# Altium footprint library Miscellaneous THD.PcbLib: 216 footprints (part 6 of 15)
Each footprint in its own frame and in the unit in brackets; x right, y up, seen from the top. Pads: shape width x height; smd on the part's side, far side on the other; paste and mask are expansions set on the pad; w line width, h text height; cw(c..) or ccw(c..) is an arc to the next point about the centre after c.
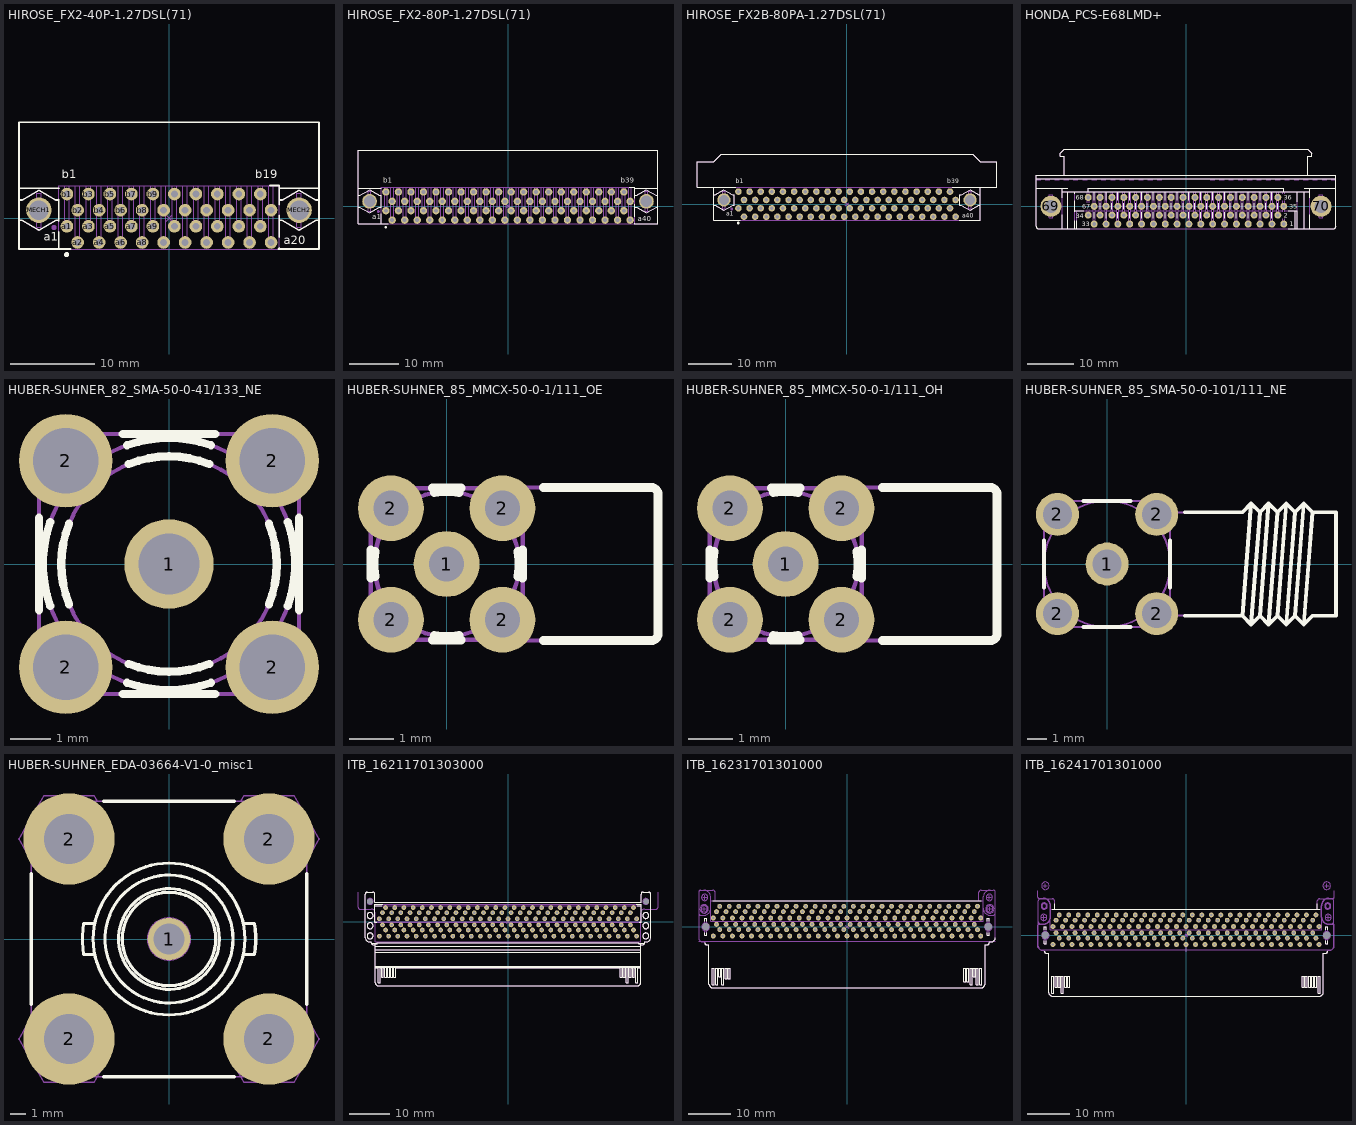
[diagram p5: the footprints below, top view; thin cyan lines are the x and y axes]

## HIROSE_FX2-40P-1.27DSL(71) [mm] "40 Contacts, 1.27mm Pitch, Right Angle Board to Board & Mezzanine Header with Prefixed Pin"
height 7.5
pads (42):
  round 1.5 hole 0.8: a1(-12.065,-0.953) a2(-10.795,-2.858) a3(-9.525,-0.953) a4(-8.255,-2.858) a5(-6.985,-0.953) a6(-5.715,-2.858) a7(-4.445,-0.953) a8(-3.175,-2.858) a9(-1.905,-0.953) a10(-0.635,-2.858) a11(0.635,-0.953) a12(1.905,-2.858) a13(3.175,-0.953) a14(4.445,-2.858) a15(5.715,-0.953) a16(6.985,-2.858) a17(8.255,-0.953) a18(9.525,-2.858) a19(10.795,-0.953) a20(12.065,-2.858) b1(-12.065,2.858) b2(-10.795,0.953) b3(-9.525,2.858) b4(-8.255,0.953) b5(-6.985,2.858) b6(-5.715,0.953) b7(-4.445,2.858) b8(-3.175,0.953) b9(-1.905,2.858) b10(-0.635,0.953) b11(0.635,2.858) b12(1.905,0.953) b13(3.175,2.858) b14(4.445,0.953) b15(5.715,2.858) b16(6.985,0.953) b17(8.255,2.858) b18(9.525,0.953) b19(10.795,2.858) b20(12.065,0.953)
  round 3 hole 2.3: MECH1(-15.375,0.953) MECH2(15.375,0.953)
Top Overlay:
  circle w0.3: c-12.1,-4.3 r0.15
  lines w0.2: -17.725,-0.243 -17.375,-0.243 -15.375,-1.398 -13.375,-0.243 -13.025,-0.243 ; -17.725,2.148 -17.375,2.148 -15.375,3.303 -13.375,2.148 -13.025,2.148 ; -13.025,-3.643 -13.025,-1.586 ; -13.025,-0.319 -13.025,2.224 ; -11.635,-3.643 -17.725,-3.643 -17.725,11.358 17.725,11.358 17.725,-3.643 12.905,-3.643 ; 11.944,3.858 13.025,3.858 13.025,1.586 ; 13.025,-3.643 13.025,-3.491 ; 13.025,-2.224 13.025,0.319 ; 13.025,-0.243 13.375,-0.243 15.375,-1.398 17.375,-0.243 17.725,-0.243 ; 13.025,2.148 13.375,2.148 15.375,3.303 17.375,2.148 17.725,2.148 ; -17.725,3.558 -12.977,3.558 -17.725,3.558 ; 13.025,3.558 17.725,3.558 13.025,3.558
  text "b19" at 10.213,4.742 h1
  text "b1" at -12.647,4.742 h1
  text "a20" at 13.588,-3.085 h1
  text "a1" at -14.787,-2.66 h1
Mechanical 8:
  drawing of 172 lines, arcs and shapes, not listed
Mechanical 14:
  circle w0.3: c-13.6,-1.1 r0.15
  lines w0.1: -17.725,-0.243 -17.375,-0.243 -15.375,-1.398 -13.375,-0.243 -13.025,-0.243 ; -17.725,2.148 -17.375,2.148 -15.375,3.303 -13.375,2.148 -13.025,2.148 ; -13.025,-3.643 -13.025,3.858 13.025,3.858 13.025,-3.643 ; -12.34,3.858 -12.34,-1.102 -11.79,-1.102 -11.79,3.858 ; -11.07,3.858 -11.07,-3.008 -10.52,-3.008 -10.52,3.858 ; -9.8,3.858 -9.8,-1.102 -9.25,-1.102 -9.25,3.858 ; -8.53,3.858 -8.53,-3.008 -7.98,-3.008 -7.98,3.858 ; -7.26,3.858 -7.26,-1.102 -6.71,-1.102 -6.71,3.858 ; -5.99,3.858 -5.99,-3.008 -5.44,-3.008 -5.44,3.858 ; -4.72,3.858 -4.72,-1.102 -4.17,-1.102 -4.17,3.858 ; -3.45,3.858 -3.45,-3.008 -2.9,-3.008 -2.9,3.858 ; -2.18,3.858 -2.18,-1.102 -1.63,-1.102 -1.63,3.858 ; -0.91,3.858 -0.91,-3.008 -0.36,-3.008 -0.36,3.858 ; 0.36,3.858 0.36,-1.102 0.91,-1.102 0.91,3.858 ; 1.63,3.858 1.63,-3.008 2.18,-3.008 2.18,3.858 ; 2.9,3.858 2.9,-1.102 3.45,-1.102 3.45,3.858 ; 4.17,3.858 4.17,-3.008 4.72,-3.008 4.72,3.858 ; 5.44,3.858 5.44,-1.102 5.99,-1.102 5.99,3.858 ; 6.71,3.858 6.71,-3.008 7.26,-3.008 7.26,3.858 ; 7.98,3.858 7.98,-1.102 8.53,-1.102 8.53,3.858 ; 9.25,3.858 9.25,-3.008 9.8,-3.008 9.8,3.858 ; 10.52,3.858 10.52,-1.102 11.07,-1.102 11.07,3.858 ; 11.79,3.858 11.79,-3.008 12.34,-3.008 12.34,3.858 ; 13.025,-0.243 13.375,-0.243 15.375,-1.398 17.375,-0.243 17.725,-0.243 ; 13.025,2.148 13.375,2.148 15.375,3.303 17.375,2.148 17.725,2.148 ; -17.725,-3.643 -17.725,11.358 17.725,11.358 17.725,-3.643 -17.725,-3.643 ; -17.725,3.558 -13.025,3.558 -17.725,3.558 ; -15.625,-1.048 -15.125,-1.048 -15.125,2.953 -15.625,2.953 -15.625,-1.048 ; 13.025,3.558 17.725,3.558 13.025,3.558 ; 15.125,-1.048 15.625,-1.048 15.625,2.953 15.125,2.953 15.125,-1.048
  text "b19" at 10.213,4.742 h1
  text "b1" at -12.647,4.742 h1
  text "a20" at 13.588,-3.085 h1
  text "a1" at -14.787,-2.66 h1
3D body "HIROSE_FX2-40P-1.27DSL(71).stp": height 7.5, standoff -3.3, extent -17.725,-3.642 17.725,11.358

## HIROSE_FX2-80P-1.27DSL(71) [mm] "80 Contacts, 1.27mm Pitch, Right Angle Board to Board & Mezzanine Header with Prefixed Pin"
height 7.5
pads (82):
  round 1.5 hole 0.8: a1(-24.765,-0.953) a2(-23.495,-2.858) a3(-22.225,-0.953) a4(-20.955,-2.858) a5(-19.685,-0.953) a6(-18.415,-2.858) a7(-17.145,-0.953) a8(-15.875,-2.858) a9(-14.605,-0.953) a10(-13.335,-2.858) a11(-12.065,-0.953) a12(-10.795,-2.858) a13(-9.525,-0.953) a14(-8.255,-2.858) a15(-6.985,-0.953) a16(-5.715,-2.858) a17(-4.445,-0.953) a18(-3.175,-2.858) a19(-1.905,-0.953) a20(-0.635,-2.858) a21(0.635,-0.953) a22(1.905,-2.858) a23(3.175,-0.953) a24(4.445,-2.858) a25(5.715,-0.953) a26(6.985,-2.858) a27(8.255,-0.953) a28(9.525,-2.858) a29(10.795,-0.953) a30(12.065,-2.858) a31(13.335,-0.953) a32(14.605,-2.858) a33(15.875,-0.953) a34(17.145,-2.858) a35(18.415,-0.953) a36(19.685,-2.858) a37(20.955,-0.953) a38(22.225,-2.858) a39(23.495,-0.953) a40(24.765,-2.858) b1(-24.765,2.858) b2(-23.495,0.953) b3(-22.225,2.858) b4(-20.955,0.953) b5(-19.685,2.858) b6(-18.415,0.953) b7(-17.145,2.858) b8(-15.875,0.953) b9(-14.605,2.858) b10(-13.335,0.953) b11(-12.065,2.858) b12(-10.795,0.953) b13(-9.525,2.858) b14(-8.255,0.953) b15(-6.985,2.858) b16(-5.715,0.953) b17(-4.445,2.858) b18(-3.175,0.953) b19(-1.905,2.858) b20(-0.635,0.953) b21(0.635,2.858) b22(1.905,0.953) b23(3.175,2.858) b24(4.445,0.953) b25(5.715,2.858) b26(6.985,0.953) b27(8.255,2.858) b28(9.525,0.953) b29(10.795,2.858) b30(12.065,0.953) b31(13.335,2.858) b32(14.605,0.953) b33(15.875,2.858) b34(17.145,0.953) b35(18.415,2.858) b36(19.685,0.953) b37(20.955,2.858) b38(22.225,0.953) b39(23.495,2.858) b40(24.765,0.953)
  round 3 hole 2.3: MECH1(-28.075,0.953) MECH2(28.075,0.953)
Top Overlay:
  circle w0.3: c-24.8,-4.3 r0.15
  lines w0.2: -30.425,-0.243 -30.075,-0.243 -28.075,-1.398 -26.075,-0.243 -25.725,-0.243 ; -30.425,2.148 -30.075,2.148 -28.075,3.303 -26.075,2.148 -25.725,2.148 ; -25.725,-3.643 -25.725,-1.586 ; -25.725,-0.319 -25.725,2.224 ; -24.335,-3.643 -30.425,-3.643 -30.425,11.358 30.425,11.358 30.425,-3.643 25.605,-3.643 ; 24.644,3.858 25.725,3.858 25.725,1.586 ; 25.725,-3.643 25.725,-3.491 ; 25.725,-2.224 25.725,0.319 ; 25.725,-0.243 26.075,-0.243 28.075,-1.398 30.075,-0.243 30.425,-0.243 ; 25.725,2.148 26.075,2.148 28.075,3.303 30.075,2.148 30.425,2.148 ; -30.425,3.558 -25.725,3.558 -30.425,3.558 ; 25.725,3.558 30.425,3.558 25.725,3.558
  text "b1" at -25.347,4.742 h1
  text "b39" at 22.913,4.742 h1
  text "a1" at -27.487,-2.66 h1
  text "a40" at 26.288,-3.085 h1
Mechanical 8:
  drawing of 332 lines, arcs and shapes, not listed
Mechanical 14:
  drawing of 156 lines, arcs and shapes, not listed
  text "b1" at -25.347,4.742 h1
  text "b39" at 22.913,4.742 h1
  text "a1" at -27.487,-2.66 h1
  text "a40" at 26.288,-3.085 h1
3D body "HIROSE_FX2-80P-1.27DSL(71).stp": height 7.5, standoff -3.3, extent -30.425,-3.642 30.425,11.358

## HIROSE_FX2B-80PA-1.27DSL(71) [mm] "80 Contacts, 1.27mm Pitch, Right Angle Board to Board & Mezzanine Header with Prefixed Pin"
height 7.5
pads (82):
  round 1.5 hole 0.8: a1(-24.765,-0.953) a2(-23.495,-2.858) a3(-22.225,-0.953) a4(-20.955,-2.858) a5(-19.685,-0.953) a6(-18.415,-2.858) a7(-17.145,-0.953) a8(-15.875,-2.858) a9(-14.605,-0.953) a10(-13.335,-2.858) a11(-12.065,-0.953) a12(-10.795,-2.858) a13(-9.525,-0.953) a14(-8.255,-2.858) a15(-6.985,-0.953) a16(-5.715,-2.858) a17(-4.445,-0.953) a18(-3.175,-2.858) a19(-1.905,-0.953) a20(-0.635,-2.858) a21(0.635,-0.953) a22(1.905,-2.858) a23(3.175,-0.953) a24(4.445,-2.858) a25(5.715,-0.953) a26(6.985,-2.858) a27(8.255,-0.953) a28(9.525,-2.858) a29(10.795,-0.953) a30(12.065,-2.858) a31(13.335,-0.953) a32(14.605,-2.858) a33(15.875,-0.953) a34(17.145,-2.858) a35(18.415,-0.953) a36(19.685,-2.858) a37(20.955,-0.953) a38(22.225,-2.858) a39(23.495,-0.953) a40(24.765,-2.858) b1(-24.765,2.858) b2(-23.495,0.953) b3(-22.225,2.858) b4(-20.955,0.953) b5(-19.685,2.858) b6(-18.415,0.953) b7(-17.145,2.858) b8(-15.875,0.953) b9(-14.605,2.858) b10(-13.335,0.953) b11(-12.065,2.858) b12(-10.795,0.953) b13(-9.525,2.858) b14(-8.255,0.953) b15(-6.985,2.858) b16(-5.715,0.953) b17(-4.445,2.858) b18(-3.175,0.953) b19(-1.905,2.858) b20(-0.635,0.953) b21(0.635,2.858) b22(1.905,0.953) b23(3.175,2.858) b24(4.445,0.953) b25(5.715,2.858) b26(6.985,0.953) b27(8.255,2.858) b28(9.525,0.953) b29(10.795,2.858) b30(12.065,0.953) b31(13.335,2.858) b32(14.605,0.953) b33(15.875,2.858) b34(17.145,0.953) b35(18.415,2.858) b36(19.685,0.953) b37(20.955,2.858) b38(22.225,0.953) b39(23.495,2.858) b40(24.765,0.953)
  round 3 hole 2.3: MECH1(-28.075,0.953) MECH2(28.075,0.953)
Top Overlay:
  circle w0.3: c-24.8,-4.3 r0.15
  lines w0.2: -30.425,-0.243 -30.075,-0.243 -28.075,-1.398 -26.075,-0.243 -25.725,-0.243 -25.725,2.148 -26.075,2.148 -28.075,3.303 -30.075,2.148 -30.425,2.148 ; -30.425,3.858 -30.425,-3.643 -24.335,-3.643 ; -25.333,3.858 -34.215,3.858 -34.215,9.708 -30.375,9.708 -28.675,11.358 28.675,11.358 30.375,9.708 34.215,9.708 34.215,3.858 24.063,3.858 ; 25.605,-3.643 30.425,-3.643 30.425,3.858 ; 30.425,-0.243 30.075,-0.243 28.075,-1.398 26.075,-0.243 25.725,-0.243 25.725,2.148 26.075,2.148 28.075,3.303 30.075,2.148 30.425,2.148
  text "b39" at 22.913,4.742 h1
  text "b1" at -25.347,4.742 h1
  text "a40" at 26.288,-3.085 h1
  text "a1" at -27.487,-2.66 h1
Mechanical 8:
  drawing of 332 lines, arcs and shapes, not listed
Mechanical 14:
  circle w0.3: c-26.3,-1.1 r0.15
  lines w0.1: -30.425,-0.243 -30.075,-0.243 -28.075,-1.398 -26.075,-0.243 -25.725,-0.243 -25.725,2.148 -26.075,2.148 -28.075,3.303 -30.075,2.148 -30.425,2.148 ; -30.425,3.858 -30.425,-3.643 30.425,-3.643 30.425,3.858 ; 30.425,-0.243 30.075,-0.243 28.075,-1.398 26.075,-0.243 25.725,-0.243 25.725,2.148 26.075,2.148 28.075,3.303 30.075,2.148 30.425,2.148 ; -34.215,3.858 -34.215,9.708 -30.375,9.708 -28.675,11.358 28.675,11.358 30.375,9.708 34.215,9.708 34.215,3.858 -34.215,3.858 ; -28.325,-1.048 -28.325,2.953 -27.825,2.953 -27.825,-1.048 -28.325,-1.048 ; 27.825,-1.048 27.825,2.953 28.325,2.953 28.325,-1.048 27.825,-1.048
  text "b39" at 22.913,4.742 h1
  text "b1" at -25.347,4.742 h1
  text "a40" at 26.288,-3.085 h1
  text "a1" at -27.487,-2.66 h1
3D body "HIROSE_FX2B-80PA-1.27DSL(71).stp": height 7.5, standoff -3.3, extent -34.215,-3.642 34.215,11.358

## HONDA_PCS-E68LMD+ [mm] "1.27mm Pitch Connector, 68 Male Contacts, Right-Angle, PCS Series"
height 9.77
pads (70):
  round 1.5 hole 0.8: 1(20.955,-3.81) 2(19.685,-1.905) 3(18.415,-3.81) 4(17.145,-1.905) 5(15.875,-3.81) 6(14.605,-1.905) 7(13.335,-3.81) 8(12.065,-1.905) 9(10.795,-3.81) 10(9.525,-1.905) 11(8.255,-3.81) 12(6.985,-1.905) 13(5.715,-3.81) 14(4.445,-1.905) 15(3.175,-3.81) 16(1.905,-1.905) 17(0.635,-3.81) 18(-0.635,-1.905) 19(-1.905,-3.81) 20(-3.175,-1.905) 21(-4.445,-3.81) 22(-5.715,-1.905) 23(-6.985,-3.81) 24(-8.255,-1.905) 25(-9.525,-3.81) 26(-10.795,-1.905) 27(-12.065,-3.81) 28(-13.335,-1.905) 29(-14.605,-3.81) 30(-15.875,-1.905) 31(-17.145,-3.81) 32(-18.415,-1.905) 33(-19.685,-3.81) 34(-20.955,-1.905) 35(20.955,0) 36(19.685,1.905) 37(18.415,0) 38(17.145,1.905) 39(15.875,0) 40(14.605,1.905) 41(13.335,0) 42(12.065,1.905) 43(10.795,0) 44(9.525,1.905) 45(8.255,0) 46(6.985,1.905) 47(5.715,0) 48(4.445,1.905) 49(3.175,0) 50(1.905,1.905) 51(0.635,0) 52(-0.635,1.905) 53(-1.905,0) 54(-3.175,1.905) 55(-4.445,0) 56(-5.715,1.905) 57(-6.985,0) 58(-8.255,1.905) 59(-9.525,0) 60(-10.795,1.905) 61(-12.065,0) 62(-13.335,1.905) 63(-14.605,0) 64(-15.875,1.905) 65(-17.145,0) 66(-18.415,1.905) 67(-19.685,0) 68(-20.955,1.905)
  round 4.5 hole 2.8: 69(-28.95,0) 70(28.95,0)
Top Overlay:
  lines w0.2: -32.15,3.905 -25.355,3.905 ; -32.15,5.905 32.15,5.905 ; -26.555,-4.795 -26.555,-1.778 ; -26.555,1.778 -26.555,3.905 ; -26.555,3.105 26.555,3.105 ; -26.05,6.705 -26.05,10.705 -26.9,10.705 -26.9,11.355 -26.05,12.205 26.05,12.205 26.9,11.355 26.9,10.705 26.05,10.705 26.05,6.705 ; -25.355,-4.795 -25.355,3.105 ; -23.855,-4.795 -23.855,-3.048 ; -23.855,-1.143 -23.855,1.143 ; -23.855,-0.953 -21.907,-0.953 ; -23.855,2.667 -23.855,3.105 ; -23.455,-4.795 -23.455,-3.048 ; -21,3.105 -21,3.905 21,3.905 21,3.105 ; -20.637,-4.795 -31.65,-4.795 cw(c-31.65,-4.295) -32.15,-4.295 -32.15,6.705 32.15,6.705 32.15,-4.295 cw(c31.65,-4.295) 31.65,-4.795 21.936,-4.795 ; -19.685,-2.54 -19.685,-1.27 ; -19.685,1.27 -19.685,3.105 ; -18.415,-0.635 -18.415,0.635 ; -17.145,-2.54 -17.145,-1.27 ; -17.145,1.27 -17.145,3.105 ; -15.875,-0.635 -15.875,0.635 ; -14.605,-2.54 -14.605,-1.27 ; -14.605,1.27 -14.605,3.105 ; -13.335,-0.635 -13.335,0.635 ; -12.065,-2.54 -12.065,-1.27 ; -12.065,1.27 -12.065,3.105 ; -10.795,-0.635 -10.795,0.635 ; -9.525,-2.54 -9.525,-1.27 ; -9.525,1.27 -9.525,3.105 ; -8.255,-0.635 -8.255,0.635 ; -6.985,-2.54 -6.985,-1.27 ; -6.985,1.27 -6.985,3.105 ; -5.715,-0.635 -5.715,0.635 ; -4.445,-2.54 -4.445,-1.27 ; -4.445,1.27 -4.445,3.105 ; -3.175,-0.635 -3.175,0.635 ; -1.905,-2.54 -1.905,-1.27 ; -1.905,1.27 -1.905,3.105 ; -0.635,-0.635 -0.635,0.635 ; 0.635,-2.54 0.635,-1.27 ; 0.635,1.27 0.635,3.105 ; 1.905,-0.635 1.905,0.635 ; 3.175,-2.54 3.175,-1.27 ; 3.175,1.27 3.175,3.105 ; 4.445,-0.635 4.445,0.635 ; 5.715,-2.54 5.715,-1.27 ; 5.715,1.27 5.715,3.105 ; 6.985,-0.635 6.985,0.635 ; 8.255,-2.54 8.255,-1.27 ; 8.255,1.27 8.255,3.105 ; 9.525,-0.635 9.525,0.635 ; 10.795,-2.54 10.795,-1.27 ; 10.795,1.27 10.795,3.105 ; 12.065,-0.635 12.065,0.635 ; 13.335,-2.54 13.335,-1.27 ; 13.335,1.27 13.335,3.105 ; 14.605,-0.635 14.605,0.635 ; 15.875,-2.54 15.875,-1.27 ; 15.875,1.27 15.875,3.105 ; 17.145,-0.635 17.145,0.635 ; 18.415,-2.54 18.415,-1.27 ; 18.415,1.27 18.415,3.105 ; 19.685,-0.635 19.685,0.635 ; 21.945,-0.953 23.855,-0.953 23.855,-4.795 ; 23.455,-4.795 23.455,-0.953 ; 23.855,1.016 23.855,3.105 ; 25.355,-4.795 25.355,3.105 ; 25.355,3.905 32.15,3.905 ; 26.555,-4.795 26.555,-1.778 ; 26.555,1.778 26.555,3.905
  text "33" at -22.345,-4.31 h1
  text "1" at 22.213,-4.31 h1
  text "2" at 20.929,-2.405 h1
  text "36" at 20.976,1.405 h1
  text "67" at -22.245,-0.5 h1
  text "34" at -23.638,-2.532 h1
  text "68" at -23.615,1.405 h1
  text "35" at 22.095,-0.5 h1
Mechanical 8:
  lines w0.1: -32.15,5.705 -31.15,5.705 ; -30.15,5.705 -29.15,5.705 ; -28.15,5.705 -27.15,5.705 ; -26.15,5.705 -25.15,5.705 ; -24.15,5.705 -23.15,5.705 ; -22.15,5.705 -21.15,5.705 ; -20.15,5.705 -19.15,5.705 ; -18.15,5.705 -17.15,5.705 ; -16.15,5.705 -15.15,5.705 ; -14.15,5.705 -13.15,5.705 ; -12.15,5.705 -11.15,5.705 ; -10.15,5.705 -9.15,5.705 ; -8.15,5.705 -7.15,5.705 ; -6.15,5.705 -5.15,5.705 ; 5.15,5.705 6.15,5.705 ; 7.15,5.705 8.15,5.705 ; 9.15,5.705 10.15,5.705 ; 11.15,5.705 12.15,5.705 ; 13.15,5.705 14.15,5.705 ; 15.15,5.705 16.15,5.705 ; 17.15,5.705 18.15,5.705 ; 19.15,5.705 20.15,5.705 ; 21.15,5.705 22.15,5.705 ; 23.15,5.705 24.15,5.705 ; 25.15,5.705 26.15,5.705 ; 27.15,5.705 28.15,5.705 ; 29.15,5.705 30.15,5.705 ; 31.15,5.705 32.15,5.705
  text "PCB EDGE" at -3.714,4.705 h1
Mechanical 14:
  drawing of 189 lines, arcs and shapes, not listed
  text "33" at -22.345,-4.31 h1
  text "1" at 22.213,-4.31 h1
  text "2" at 20.929,-2.405 h1
  text "36" at 20.976,1.405 h1
  text "67" at -22.245,-0.5 h1
  text "34" at -23.638,-2.532 h1
  text "68" at -23.615,1.405 h1
  text "35" at 22.095,-0.5 h1
3D body "HONDA_PCS-E68LMD+.stp": height 9.77, standoff -3.4, extent -32.15,-4.795 32.15,12.205

## HUBER-SUHNER_82_SMA-50-0-41/133_NE [mm] "50 Ohm SMA Straight PCB Jack"
height 9.5
pads (5):
  round 2.2 hole 1.5: 1(0,0)
  round 2.3 hole 1.6: 2(-2.54,-2.54) 2(-2.54,2.54) 2(2.54,-2.54) 2(2.54,2.54)
Top Overlay:
  lines w0.2: -3.2,-1.138 -3.2,1.138 ; -2.921,-1.038 cw(c0,0) -2.921,1.038 ; -2.457,-0.992 cw(c0,0) -2.457,0.992 ; -1.138,-3.2 1.138,-3.2 ; -1.138,3.2 1.138,3.2 ; -1.038,-2.921 ccw(c0,0) 1.038,-2.921 ; -1.038,2.921 cw(c0,0) 1.038,2.921 ; -0.992,-2.457 ccw(c0,0) 0.992,-2.457 ; -0.992,2.457 cw(c0,0) 0.992,2.457 ; 2.457,-0.992 ccw(c0,0) 2.457,0.992 ; 2.921,-1.038 ccw(c0,0) 2.921,1.038 ; 3.2,-1.138 3.2,1.138
Mechanical 8:
  lines w0.1: -3.54,-2.54 -2.54,-2.54 ; -3.54,2.54 -2.54,2.54 ; -2.54,-3.54 -2.54,-2.54 ; -2.54,-1.54 -2.54,-2.54 ; -2.54,1.54 -2.54,2.54 ; -2.54,3.54 -2.54,2.54 ; -1.54,-2.54 -2.54,-2.54 ; -1.54,2.54 -2.54,2.54 ; -1,0 0,0 ; 0,-1 0,0 ; 0,1 0,0 ; 1,0 0,0 ; 1.54,-2.54 2.54,-2.54 ; 1.54,2.54 2.54,2.54 ; 2.54,-3.54 2.54,-2.54 ; 2.54,-1.54 2.54,-2.54 ; 2.54,1.54 2.54,2.54 ; 2.54,3.54 2.54,2.54 ; 3.54,-2.54 2.54,-2.54 ; 3.54,2.54 2.54,2.54
Mechanical 14:
  circle w0.1: c0,0 r3.1
  circle w0.1: c0,0 r2.65
  circle w0.1: c0,0 r0.5
  lines w0.1: -3.2,-3.2 3.2,-3.2 3.2,3.2 -3.2,3.2 -3.2,-3.2
3D body "HUBER-SUHNER_82_SMA-50-0-41-133_NE.stp": height 9.5, standoff -4, extent -3.2,-3.2 3.2,3.2

## HUBER-SUHNER_85_MMCX-50-0-1/111_OE [mm] "MMCX 50 Ohm Right Angle PCB Jack"
height 3.8
pads (5):
  round 1.5 hole 0.8: 1(0,0) 2(-1.27,-1.27) 2(-1.27,1.27) 2(1.27,-1.27) 2(1.27,1.27)
Top Overlay:
  lines w0.2: -1.73,-0.326 -1.73,0.326 ; -1.626,-0.282 cw(c0,0) -1.626,0.282 ; -0.326,-1.73 0.326,-1.73 ; -0.326,1.73 0.326,1.73 ; -0.282,-1.626 ccw(c0,0) 0.282,-1.626 ; -0.282,1.626 cw(c0,0) 0.282,1.626 ; 1.626,-0.282 ccw(c0,0) 1.626,0.282 ; 2.208,-1.743 4.665,-1.743 ccw(c4.665,-1.593) 4.815,-1.593 4.815,1.593 ccw(c4.665,1.593) 4.665,1.743 2.208,1.743 ; 1.73,-0.326 1.73,0.326 1.73,-0.326
Mechanical 8:
  lines w0.1: -1.77,-1.27 -1.27,-1.27 ; -1.77,1.27 -1.27,1.27 ; -1.27,-1.77 -1.27,-1.27 ; -1.27,-0.77 -1.27,-1.27 ; -1.27,0.77 -1.27,1.27 ; -1.27,1.77 -1.27,1.27 ; -0.77,-1.27 -1.27,-1.27 ; -0.77,1.27 -1.27,1.27 ; -0.5,0 0,0 ; 0,-0.5 0,0 ; 0,0.5 0,0 ; 0.5,0 0,0 ; 0.77,-1.27 1.27,-1.27 ; 0.77,1.27 1.27,1.27 ; 1.27,-1.77 1.27,-1.27 ; 1.27,-0.77 1.27,-1.27 ; 1.27,0.77 1.27,1.27 ; 1.27,1.77 1.27,1.27 ; 1.77,-1.27 1.27,-1.27 ; 1.77,1.27 1.27,1.27
Mechanical 14:
  circle w0.1: c0,0 r1.65
  lines w0.1: -1.73,-1.73 1.73,-1.73 1.73,1.73 -1.73,1.73 -1.73,-1.73 ; 1.73,-1.743 1.73,1.743 4.665,1.743 cw(c4.665,1.593) 4.815,1.593 4.815,-1.593 cw(c4.665,-1.593) 4.665,-1.743 1.73,-1.743
3D body "HUBER-SUHNER_85_MMCX-50-0-1-111_OE.stp": height 3.8, standoff -3, extent -1.73,-1.742 4.815,1.743

## HUBER-SUHNER_85_MMCX-50-0-1/111_OH [mm] "MMCX 50 Ohm Right Angle PCB Jack"
height 3.8
pads (5):
  round 1.5 hole 0.8: 1(0,0) 2(-1.27,-1.27) 2(-1.27,1.27) 2(1.27,-1.27) 2(1.27,1.27)
Top Overlay:
  lines w0.2: -1.73,-0.326 -1.73,0.326 ; -1.626,-0.282 cw(c0,0) -1.626,0.282 ; -0.326,-1.73 0.326,-1.73 ; -0.326,1.73 0.326,1.73 ; -0.282,-1.626 ccw(c0,0) 0.282,-1.626 ; -0.282,1.626 cw(c0,0) 0.282,1.626 ; 1.626,-0.282 ccw(c0,0) 1.626,0.282 ; 2.208,-1.743 4.665,-1.743 ccw(c4.665,-1.593) 4.815,-1.593 4.815,1.593 ccw(c4.665,1.593) 4.665,1.743 2.208,1.743 ; 1.73,-0.326 1.73,0.326 1.73,-0.326
Mechanical 8:
  lines w0.1: -1.77,-1.27 -1.27,-1.27 ; -1.77,1.27 -1.27,1.27 ; -1.27,-1.77 -1.27,-1.27 ; -1.27,-0.77 -1.27,-1.27 ; -1.27,0.77 -1.27,1.27 ; -1.27,1.77 -1.27,1.27 ; -0.77,-1.27 -1.27,-1.27 ; -0.77,1.27 -1.27,1.27 ; -0.5,0 0,0 ; 0,-0.5 0,0 ; 0,0.5 0,0 ; 0.5,0 0,0 ; 0.77,-1.27 1.27,-1.27 ; 0.77,1.27 1.27,1.27 ; 1.27,-1.77 1.27,-1.27 ; 1.27,-0.77 1.27,-1.27 ; 1.27,0.77 1.27,1.27 ; 1.27,1.77 1.27,1.27 ; 1.77,-1.27 1.27,-1.27 ; 1.77,1.27 1.27,1.27
Mechanical 14:
  circle w0.1: c0,0 r1.65
  lines w0.1: -1.73,-1.73 -1.73,1.73 1.73,1.73 1.73,-1.73 -1.73,-1.73 ; 1.73,-1.743 4.665,-1.743 ccw(c4.665,-1.593) 4.815,-1.593 4.815,1.593 ccw(c4.665,1.593) 4.665,1.743 1.73,1.743 1.73,-1.743
3D body "HUBER-SUHNER_85_MMCX-50-0-1-111_OH.stp": height 3.8, standoff -3, extent -1.73,-1.742 4.815,1.743

## HUBER-SUHNER_85_SMA-50-0-101/111_NE [mm] "50 Ohm SMA Right Angle PCB Jack"
height 9.6
pads (5):
  round 2.2 hole 1.5: 1(0,0) 2(-2.54,-2.54) 2(-2.54,2.54) 2(2.54,-2.54) 2(2.54,2.54)
Top Overlay:
  lines w0.2: -3.23,-1.208 -3.23,1.208 ; -1.208,-3.23 1.208,-3.23 ; -1.208,3.23 1.208,3.23 ; 3.23,-1.208 3.23,1.208 ; 4,-2.65 6.93,-2.65 ; 4,2.65 6.93,2.65 7.38,3.1 ; 6.93,-2.65 7.38,-3.1 ; 6.93,-2.65 7.38,3.1 ; 7.38,-3.1 7.83,-2.65 ; 7.38,-3.1 7.83,2.65 ; 7.38,3.1 7.83,2.65 ; 7.83,-2.65 8.28,-3.1 ; 7.83,-2.65 8.28,3.1 ; 7.83,2.65 8.28,3.1 ; 8.28,-3.1 8.73,-2.65 ; 8.28,-3.1 8.73,2.65 ; 8.28,3.1 8.73,2.65 ; 8.73,-2.65 9.18,-3.1 ; 8.73,-2.65 9.18,3.1 ; 8.73,2.65 9.18,3.1 ; 9.18,-3.1 9.63,-2.65 ; 9.18,-3.1 9.63,2.65 ; 9.18,3.1 9.63,2.65 ; 9.63,-2.65 10.08,-3.1 ; 9.63,-2.65 10.08,3.1 ; 9.63,2.65 10.08,3.1 ; 10.08,-3.1 10.53,-2.65 11.73,-2.65 11.73,2.65 10.53,2.65 ; 10.08,-3.1 10.53,2.65 ; 10.08,3.1 10.53,2.65
Mechanical 8:
  lines w0.1: -3.54,-2.54 -2.54,-2.54 ; -3.54,2.54 -2.54,2.54 ; -2.54,-3.54 -2.54,-2.54 ; -2.54,-1.54 -2.54,-2.54 ; -2.54,1.54 -2.54,2.54 ; -2.54,3.54 -2.54,2.54 ; -1.54,-2.54 -2.54,-2.54 ; -1.54,2.54 -2.54,2.54 ; -1,0 0,0 ; 0,-1 0,0 ; 0,1 0,0 ; 1,0 0,0 ; 1.54,-2.54 2.54,-2.54 ; 1.54,2.54 2.54,2.54 ; 2.54,-3.54 2.54,-2.54 ; 2.54,-1.54 2.54,-2.54 ; 2.54,1.54 2.54,2.54 ; 2.54,3.54 2.54,2.54 ; 3.54,-2.54 2.54,-2.54 ; 3.54,2.54 2.54,2.54
Mechanical 14:
  circle w0.1: c0,0 r0.63
  circle w0.1: c0,0 r3.23
  lines w0.1: 2.558,-3.23 3.23,-2.558 ; 3.23,-2.65 6.93,-2.65 ; 3.23,2.65 6.93,2.65 7.38,3.1 ; 6.93,-2.65 7.38,-3.1 ; 6.93,-2.65 7.38,3.1 ; 7.38,-3.1 7.83,-2.65 ; 7.38,-3.1 7.83,2.65 ; 7.38,3.1 7.83,2.65 ; 7.83,-2.65 8.28,-3.1 ; 7.83,-2.65 8.28,3.1 ; 7.83,2.65 8.28,3.1 ; 8.28,-3.1 8.73,-2.65 ; 8.28,-3.1 8.73,2.65 ; 8.28,3.1 8.73,2.65 ; 8.73,-2.65 9.18,-3.1 ; 8.73,-2.65 9.18,3.1 ; 8.73,2.65 9.18,3.1 ; 9.18,-3.1 9.63,-2.65 ; 9.18,-3.1 9.63,2.65 ; 9.18,3.1 9.63,2.65 ; 9.63,-2.65 10.08,-3.1 ; 9.63,-2.65 10.08,3.1 ; 9.63,2.65 10.08,3.1 ; 10.08,-3.1 10.53,-2.65 11.73,-2.65 11.73,2.65 10.53,2.65 ; 10.08,-3.1 10.53,2.65 ; 10.08,3.1 10.53,2.65 ; -3.23,-3.23 -3.23,3.23 3.23,3.23 3.23,-3.23 -3.23,-3.23
3D body "HUBER-SUHNER_85_SMA-50-0-101-111_NE.stp": height 9.6, standoff -4, extent -3.23,-3.23 11.73,3.23
